# Altium footprint library myPcbLib.PcbLib: 987 footprints (part 44 of 62)
Each footprint in its own frame and in the unit in brackets; x right, y up, seen from the top. Pads: shape width x height; smd on the part's side, far side on the other; paste and mask are expansions set on the pad; w line width, h text height; cw(c..) or ccw(c..) is an arc to the next point about the centre after c.
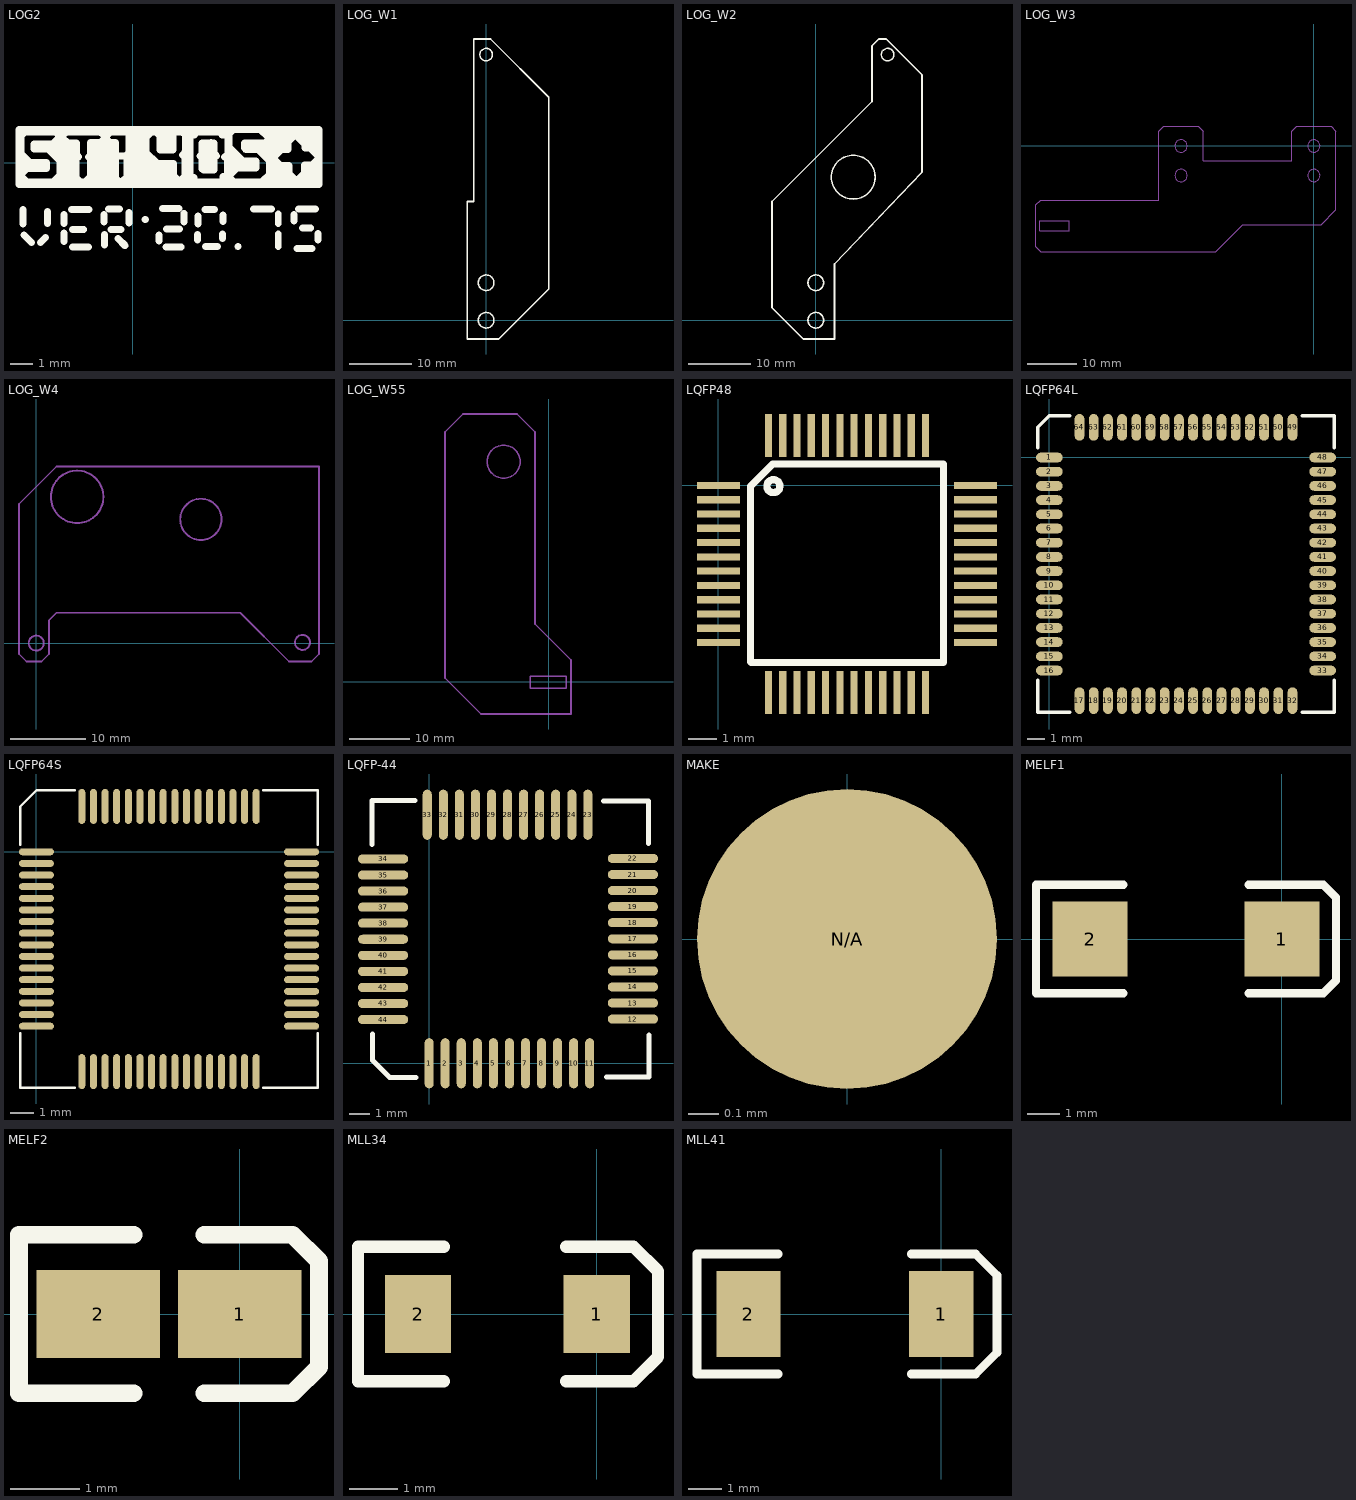
[diagram p43: the footprints below, top view; thin cyan lines are the x and y axes]

## LOG2 [mm]
Top Overlay:
  drawing of 230 lines, arcs and shapes, not listed

## LOG_W1 [mm]
Top Overlay:
  circle w0.254: c0,42.5 r1
  circle w0.254: c0,6 r1.25
  circle w0.254: c0,0 r1.25
  lines w0.254: -3,-3 2,-3 10,5 10,35.7 0.7,45 -2,45 -2,19 -3,19 -3,-3

## LOG_W2 [mm]
Top Overlay:
  circle w0.254: c11.5,42.5 r1
  circle w0.254: c0,0 r1.25
  circle w0.254: c0,6 r1.25
  circle w0.254: c5.999,22.9 r3.501
  lines w0.254: -7,2 -2,-3 3,-3 3,9 17,23.671 17,39.3 11.3,45 10.1,45 9,43.9 9,35 -7,19 -7,2

## LOG_W3 [mm]
Mechanical 1:
  circle w0.254: c-27,0 r1.25
  circle w0.254: c-27,-6 r1.25
  circle w0.254: c0,0 r1.25
  circle w0.254: c0,-6 r1.25
  lines w0.254: -56.5,-20.5 -55.5,-21.5 -20,-21.5 -14.5,-16 1.5,-16 4.5,-13 4.5,3 3.5,4 -3.5,4 -4.5,3 -4.5,-3 -22.5,-3 -22.5,3 -23.5,4 -30.5,4 -31.5,3 -31.5,-11 -55.5,-11 -56.5,-12 -56.5,-20.5 ; -55.75,-17.25 -49.75,-17.25 -49.75,-15.25 -55.75,-15.25 -55.75,-17.25

## LOG_W4 [mm]
Mechanical 1:
  circle w0.254: c5.45,19.5 r3.5
  circle w0.254: c21.95,16.5 r2.75
  circle w0.254: c35.5,0.1 r1
  circle w0.254: c0,0 r1
  lines w0.254: -2.3,-1.45 -2.3,18.55 2.7,23.55 37.7,23.55 37.7,-1.45 36.7,-2.45 33.7,-2.45 27.2,4.05 2.7,4.05 1.7,3.05 1.7,-1.45 0.7,-2.45 -1.3,-2.45 -2.3,-1.45

## LOG_W55 [mm]
Mechanical 1:
  circle w0.254: c-7.475,36.7 r2.75
  lines w0.254: -17.25,0.65 -17.25,41.65 -14.25,44.65 -5.25,44.65 -2.25,41.65 -2.25,9.65 3.75,3.65 3.75,-5.35 -11.25,-5.35 -17.25,0.65 ; -3.025,-1.075 -3.025,0.925 2.975,0.925 2.975,-1.075 -3.025,-1.075

## LQFP48 [mm]
pads (48):
  rect 1.5x0.25 smd: 1(-0.001,0.002) 2(-0.001,-0.498) 3(-0.001,-0.998) 4(-0.001,-1.498) 5(-0.001,-1.998) 6(-0.001,-2.498) 7(-0.001,-2.998) 8(-0.001,-3.498) 9(-0.001,-3.998) 10(-0.001,-4.498) 11(-0.001,-4.998) 12(-0.001,-5.498) 25(8.999,-5.498) 26(8.999,-4.998) 27(8.999,-4.498) 28(8.999,-3.998) 29(8.999,-3.498) 30(8.999,-2.998) 31(8.999,-2.498) 32(8.999,-1.998) 33(8.999,-1.498) 34(8.999,-0.998) 35(8.999,-0.498) 36(8.999,0.002)
  rect 0.25x1.5 smd: 13(1.749,-7.248) 14(2.249,-7.248) 15(2.749,-7.248) 16(3.249,-7.248) 17(3.749,-7.248) 18(4.249,-7.248) 19(4.749,-7.248) 20(5.249,-7.248) 21(5.749,-7.248) 22(6.249,-7.248) 23(6.749,-7.248) 24(7.249,-7.248) 37(7.249,1.752) 38(6.749,1.752) 39(6.249,1.752) 40(5.749,1.752) 41(5.249,1.752) 42(4.749,1.752) 43(4.249,1.752) 44(3.749,1.752) 45(3.249,1.752) 46(2.749,1.752) 47(2.249,1.752) 48(1.749,1.752)
Top Overlay:
  lines w0.254: 1.99,-0.239 cw(c1.924,-0.023) 2.013,-0.231 ; 1.124,-6.173 1.124,-0.023 1.899,0.752 7.874,0.752 7.874,-6.198 1.149,-6.198 1.124,-6.173

## LQFP64L [mm]
pads (64):
  oval 1.5x0.55 smd: 1(0,0) 2(0,-0.8) 3(0,-1.6) 4(0,-2.4) 5(0,-3.2) 6(0,-4) 7(0,-4.8) 8(0,-5.6) 9(0,-6.4) 10(0,-7.2) 11(0,-8) 12(0,-8.8) 13(0,-9.6) 14(0,-10.4) 15(0,-11.2) 16(0,-12) 33(15.4,-12) 34(15.4,-11.2) 35(15.4,-10.4) 36(15.4,-9.6) 37(15.4,-8.8) 38(15.4,-8) 39(15.4,-7.2) 40(15.4,-6.4) 41(15.4,-5.6) 42(15.4,-4.8) 43(15.4,-4) 44(15.4,-3.2) 45(15.4,-2.4) 46(15.4,-1.6) 47(15.4,-0.8) 48(15.4,0)
  oval 0.55x1.5 smd: 17(1.7,-13.7) 18(2.5,-13.7) 19(3.3,-13.7) 20(4.1,-13.7) 21(4.9,-13.7) 22(5.7,-13.7) 23(6.5,-13.7) 24(7.3,-13.7) 25(8.1,-13.7) 26(8.9,-13.7) 27(9.7,-13.7) 28(10.5,-13.7) 29(11.3,-13.7) 30(12.1,-13.7) 31(12.9,-13.7) 32(13.7,-13.7) 49(13.7,1.7) 50(12.9,1.7) 51(12.1,1.7) 52(11.3,1.7) 53(10.5,1.7) 54(9.7,1.7) 55(8.9,1.7) 56(8.1,1.7) 57(7.3,1.7) 58(6.5,1.7) 59(5.7,1.7) 60(4.9,1.7) 61(4.1,1.7) 62(3.3,1.7) 63(2.5,1.7) 64(1.7,1.7)
Top Overlay:
  lines w0.2: -0.65,-12.55 -0.65,-14.35 1.15,-14.35 ; -0.65,0.55 -0.65,1.7 0,2.35 1.15,2.35 ; 14.25,-14.35 16.05,-14.35 16.05,-12.55 ; 14.25,2.35 16.05,2.35 16.05,0.55

## LQFP64S [mm]
height 1.6
pads (64):
  oval 1.5x0.3 smd: 1(0,0) 2(0,-0.5) 3(0,-1) 4(0,-1.5) 5(0,-2) 6(0,-2.5) 7(0,-3) 8(0,-3.5) 9(0,-4) 10(0,-4.5) 11(0,-5) 12(0,-5.5) 13(0,-6) 14(0,-6.5) 15(0,-7) 16(0,-7.5) 33(11.4,-7.5) 34(11.4,-7) 35(11.4,-6.5) 36(11.4,-6) 37(11.4,-5.5) 38(11.4,-5) 39(11.4,-4.5) 40(11.4,-4) 41(11.4,-3.5) 42(11.4,-3) 43(11.4,-2.5) 44(11.4,-2) 45(11.4,-1.5) 46(11.4,-1) 47(11.4,-0.5) 48(11.4,0)
  oval 0.3x1.5 smd: 17(1.95,-9.45) 18(2.45,-9.45) 19(2.95,-9.45) 20(3.45,-9.45) 21(3.95,-9.45) 22(4.45,-9.45) 23(4.95,-9.45) 24(5.45,-9.45) 25(5.95,-9.45) 26(6.45,-9.45) 27(6.95,-9.45) 28(7.45,-9.45) 29(7.95,-9.45) 30(8.45,-9.45) 31(8.95,-9.45) 32(9.45,-9.45) 49(9.45,1.95) 50(8.95,1.95) 51(8.45,1.95) 52(7.95,1.95) 53(7.45,1.95) 54(6.95,1.95) 55(6.45,1.95) 56(5.95,1.95) 57(5.45,1.95) 58(4.95,1.95) 59(4.45,1.95) 60(3.95,1.95) 61(3.45,1.95) 62(2.95,1.95) 63(2.45,1.95) 64(1.95,1.95)
Top Overlay:
  lines w0.1: -0.7,-7.8 -0.7,-10.15 1.65,-10.15 ; -0.7,0.3 -0.7,1.95 0,2.65 1.65,2.65 ; 9.75,-10.15 12.1,-10.15 12.1,-7.8 ; 9.75,2.65 12.1,2.65 12.1,0.3

## LQFP-44 [mm]
height 2
pads (44):
  oval 0.45x2.5 smd: 1(0,0) 2(0.8,0) 3(1.6,0) 4(2.4,0) 5(3.2,0) 6(4,0) 7(4.8,0) 8(5.6,0) 9(6.4,0) 10(7.2,0) 11(8,0) 23(7.906,12.385) 24(7.106,12.385) 25(6.306,12.385) 26(5.506,12.385) 27(4.706,12.385) 28(3.906,12.385) 29(3.106,12.385) 30(2.306,12.385) 31(1.506,12.385) 32(0.706,12.385) 33(-0.094,12.385)
  oval 2.5x0.45 smd: 12(10.152,2.203) 13(10.152,3.003) 14(10.152,3.803) 15(10.152,4.603) 16(10.152,5.403) 17(10.152,6.203) 18(10.152,7.003) 19(10.152,7.803) 20(10.152,8.603) 21(10.152,9.403) 22(10.152,10.203) 34(-2.294,10.179) 35(-2.294,9.379) 36(-2.294,8.579) 37(-2.294,7.779) 38(-2.294,6.979) 39(-2.294,6.179) 40(-2.294,5.379) 41(-2.294,4.579) 42(-2.294,3.779) 43(-2.294,2.979) 44(-2.294,2.179)
Top Overlay:
  lines w0.25: -2.857,10.892 -2.857,13.094 -0.709,13.094 ; -2.815,1.452 -2.815,0.14 -1.979,-0.696 -0.667,-0.696 ; 8.678,13.062 10.922,13.062 10.922,10.945 ; 8.837,-0.675 10.954,-0.675 10.954,1.42

## LQFP_48_S [mm] "MIPAI"

## MAKE [mm]
pads (1):
  round 1 smd mask+1: N/A(0,0)

## MELF1 [mil]
pads (2):
  rect 90x90 smd: 1(0,0) 2(-230,0)
Top Overlay:
  lines w10: -190,-65 -295,-65 -295,65 -190,65 ; -40,-65 50,-65 65,-50 65,50 50,65 -40,65

## MELF2 [mil]
pads (2):
  rect 70x50 smd: 1(0,0) 2(-80,0)
Top Overlay:
  lines w10: -60,-45 -125,-45 -125,45 -60,45 ; -20,-45 30,-45 45,-30 45,30 30,45 -20,45

## MLL34 [mil]
pads (2):
  rect 54x64 smd: 1(0,0) 2(-146,0)
Top Overlay:
  lines w10: -125,-55 -195,-55 -195,55 -125,55 ; -25,-55 30,-55 50,-35 50,35 30,55 -25,55

## MLL41 [mm]
pads (2):
  rect 1.905x2.54 smd: 1(0,0) 2(-5.715,0)
Top Overlay:
  lines w0.254: -4.826,-1.778 -7.239,-1.778 -7.239,1.778 -4.826,1.778 ; -0.889,-1.778 1.016,-1.778 1.651,-1.143 1.651,1.143 1.016,1.778 -0.889,1.778